# Altium footprint library NRF91.PcbLib: 113 footprints (part 6 of 8)
Each footprint in its own frame and in the unit in brackets; x right, y up, seen from the top. Pads: shape width x height; smd on the part's side, far side on the other; paste and mask are expansions set on the pad; w line width, h text height; cw(c..) or ccw(c..) is an arc to the next point about the centre after c.
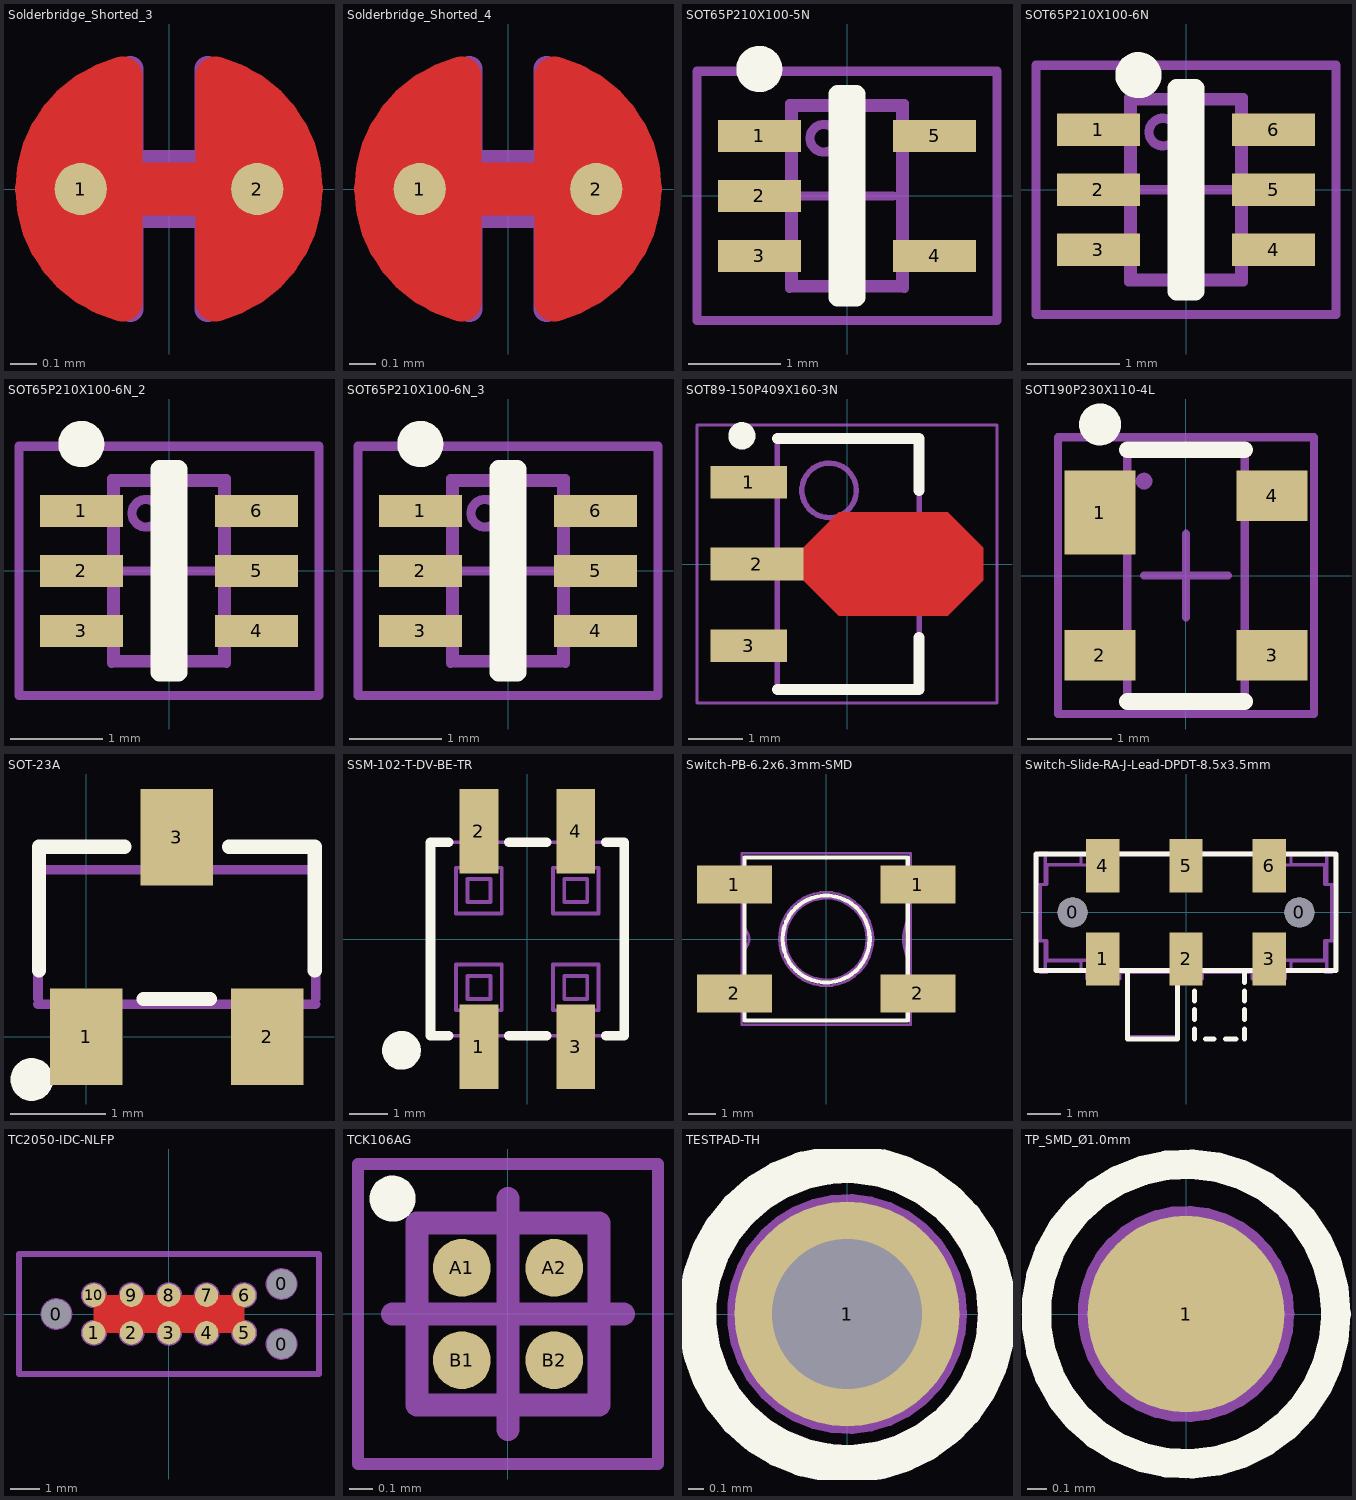
[diagram p5: the footprints below, top view; thin cyan lines are the x and y axes]

## Solderbridge_Shorted_3 [mm]
pads (2):
  round 0.2 smd paste-10: 1(-0.338,0) 2(0.338,0)
Top Layer:
  region: 0.102,0.432 0.178,0.505 0.296,0.467 0.361,0.424 0.434,0.351 0.488,0.292 0.546,0.193 0.574,0.099 0.569,-0.122 0.544,-0.193 0.46,-0.33 0.376,-0.411 0.284,-0.469 0.183,-0.5 0.132,-0.483 0.102,-0.43
  region: -0.102,-0.432 -0.178,-0.505 -0.296,-0.467 -0.361,-0.424 -0.434,-0.351 -0.488,-0.292 -0.546,-0.193 -0.574,-0.099 -0.569,0.122 -0.544,0.193 -0.46,0.33 -0.376,0.411 -0.284,0.469 -0.183,0.5 -0.132,0.483 -0.102,0.43
  lines w0.152: -0.178,-0.431 cw(c-0.068,0) -0.178,0.431 ; 0.178,-0.431 ccw(c0.068,0) 0.178,0.431
  lines w0.203: -0.338,0 0.338,0
Top Solder:
  circle w0.61: c-0.028,0 r0.279
  circle w0.61: c0.028,0 r0.279
Mechanical 7:
  lines w0.1: -0.148,-0.459 cw(c-0.067,0) -0.148,0.459 -0.148,0.1 0.148,0.1 0.148,0.459 cw(c0.067,0) 0.148,-0.459 0.148,-0.1 -0.148,-0.1 -0.148,-0.459
  text ".Designator" at -0.635,0.635 h0.38

## Solderbridge_Shorted_4 [mm]
pads (2):
  round 0.2 smd paste-10: 1(-0.338,0) 2(0.338,0)
Top Layer:
  region: 0.102,0.432 0.178,0.505 0.296,0.467 0.361,0.424 0.434,0.351 0.488,0.292 0.546,0.193 0.574,0.099 0.569,-0.122 0.544,-0.193 0.46,-0.33 0.376,-0.411 0.284,-0.469 0.183,-0.5 0.132,-0.483 0.102,-0.43
  region: -0.102,-0.432 -0.178,-0.505 -0.296,-0.467 -0.361,-0.424 -0.434,-0.351 -0.488,-0.292 -0.546,-0.193 -0.574,-0.099 -0.569,0.122 -0.544,0.193 -0.46,0.33 -0.376,0.411 -0.284,0.469 -0.183,0.5 -0.132,0.483 -0.102,0.43
  lines w0.152: -0.178,-0.431 cw(c-0.068,0) -0.178,0.431 ; 0.178,-0.431 ccw(c0.068,0) 0.178,0.431
  lines w0.203: -0.338,0 0.338,0
Top Solder:
  circle w0.61: c-0.028,0 r0.279
  circle w0.61: c0.028,0 r0.279
Mechanical 7:
  lines w0.1: -0.148,-0.459 cw(c-0.067,0) -0.148,0.459 -0.148,0.1 0.148,0.1 0.148,0.459 cw(c0.067,0) 0.148,-0.459 0.148,-0.1 -0.148,-0.1 -0.148,-0.459
  text ".Designator" at -0.635,0.635 h0.38

## SOT65P210X100-5N [mm]
pads (5):
  rect 0.9x0.35 smd: 1(-0.95,0.65) 2(-0.95,0) 3(-0.95,-0.65) 4(0.95,-0.65) 5(0.95,0.65)
Top Overlay:
  circle w0.25: c-0.95,1.375 r0.125
  lines w0.2: -0.1,-1.1 -0.1,1.1 0.1,1.1 0.1,-1.1 -0.1,-1.1
Mechanical 7:
  circle w0.1: c-0.25,0.625 r0.15
  lines w0.1: -1.048,-0.748 -1.048,-0.545 ; -1.048,-0.101 -1.048,0.103 ; -1.048,0.547 -1.048,0.75 ; -0.862,-0.76 -0.862,-0.532 ; -0.862,-0.113 -0.862,0.115 ; -0.862,0.534 -0.862,0.762 ; -0.624,-0.999 -0.624,-0.998 ; -0.624,-0.76 -0.624,-0.998 ; -0.624,-0.532 -0.624,-0.113 ; -0.624,0.115 -0.624,0.534 ; -0.624,0.762 -0.624,1 0.624,1 0.624,0.762 ; 0.624,-0.999 0.624,-0.998 ; 0.624,-0.76 0.624,-0.998 ; 0.624,-0.532 0.624,0.534 ; 0.862,-0.76 0.862,-0.532 ; 0.862,0.534 0.862,0.762 ; 1.048,-0.748 1.048,-0.545 ; 1.048,0.547 1.048,0.75 ; -0.624,-0.998 0.624,-0.998 ; -1.048,-0.76 -0.611,-0.76 -0.611,-0.532 -1.048,-0.532 -1.048,-0.76 ; -1.048,-0.113 -1.048,0.115 -0.611,0.115 -0.611,-0.113 -1.048,-0.113 ; -1.048,0.534 -0.611,0.534 -0.611,0.762 -1.048,0.762 -1.048,0.534 ; -0.582,-0.96 -0.582,0.961 0.582,0.961 0.582,-0.96 -0.582,-0.96 ; 0.611,-0.76 0.611,-0.532 1.048,-0.532 1.048,-0.76 0.611,-0.76 ; 0.611,0.534 0.611,0.762 1.048,0.762 1.048,0.534 0.611,0.534
  text ".Designator" at 0.4,-0.55 h0.38
Mechanical 15:
  lines w0.1: -0.5,0 0.5,0 ; 0,-0.5 0,0.5 ; -1.625,-1.35 1.625,-1.35 1.625,1.35 -1.625,1.35 -1.625,-1.35
3D body "User Library-SC70-5.STEP": height 0.97, standoff 0, extent -1.1,-1 1.1,1

## SOT65P210X100-6N [mm]
pads (6):
  rect 0.9x0.35 smd: 1(-0.95,0.65) 2(-0.95,0) 3(-0.95,-0.65) 4(0.95,-0.65) 5(0.95,0) 6(0.95,0.65)
Top Overlay:
  circle w0.25: c-0.515,1.242 r0.125
  lines w0.2: -0.1,-1.1 -0.1,1.1 0.1,1.1 0.1,-1.1 -0.1,-1.1
Mechanical 7:
  circle w0.1: c-0.25,0.625 r0.15
  lines w0.1: -1.048,-0.748 -1.048,-0.545 ; -1.048,-0.101 -1.048,0.103 ; -1.048,0.547 -1.048,0.75 ; -0.862,-0.76 -0.862,-0.532 ; -0.862,-0.113 -0.862,0.115 ; -0.862,0.534 -0.862,0.762 ; -0.624,-0.999 -0.624,-0.998 ; -0.624,-0.76 -0.624,-0.998 ; -0.624,-0.532 -0.624,-0.113 ; -0.624,0.115 -0.624,0.534 ; -0.624,0.762 -0.624,1 0.624,1 0.624,0.762 ; 0.624,-0.999 0.624,-0.998 ; 0.624,-0.76 0.624,-0.998 ; 0.624,-0.532 0.624,-0.113 ; 0.624,0.115 0.624,0.534 ; 0.862,-0.76 0.862,-0.532 ; 0.862,-0.113 0.862,0.115 ; 0.862,0.534 0.862,0.762 ; 1.048,-0.748 1.048,-0.545 ; 1.048,-0.101 1.048,0.103 ; 1.048,0.547 1.048,0.75 ; -0.624,-0.998 0.624,-0.998 ; -1.048,-0.76 -1.048,-0.532 -0.611,-0.532 -0.611,-0.76 -1.048,-0.76 ; -1.048,-0.113 -0.611,-0.113 -0.611,0.115 -1.048,0.115 -1.048,-0.113 ; -1.048,0.534 -1.048,0.762 -0.611,0.762 -0.611,0.534 -1.048,0.534 ; -0.582,-0.96 0.582,-0.96 0.582,0.961 -0.582,0.961 -0.582,-0.96 ; 0.611,-0.76 1.048,-0.76 1.048,-0.532 0.611,-0.532 0.611,-0.76 ; 0.611,-0.113 0.611,0.115 1.048,0.115 1.048,-0.113 0.611,-0.113 ; 0.611,0.534 1.048,0.534 1.048,0.762 0.611,0.762 0.611,0.534
  text ".Designator" at 0.4,-0.55 h0.38
Mechanical 15:
  lines w0.1: -0.5,0 0.5,0 ; 0,-0.5 0,0.5 ; -1.625,-1.35 1.625,-1.35 1.625,1.35 -1.625,1.35 -1.625,-1.35
3D body "SW3dPS-SC70-6.STEP": height 0.92, standoff -0.03, extent -1.05,-1 1.05,1

## SOT65P210X100-6N_2 [mm]
pads (6):
  rect 0.9x0.35 smd: 1(-0.95,0.65) 2(-0.95,0) 3(-0.95,-0.65) 4(0.95,-0.65) 5(0.95,0) 6(0.95,0.65)
Top Overlay:
  circle w0.25: c-0.95,1.375 r0.125
  lines w0.2: -0.1,-1.1 0.1,-1.1 0.1,1.1 -0.1,1.1 -0.1,-1.1
Mechanical 7:
  circle w0.1: c-0.25,0.625 r0.15
  lines w0.1: -1.048,-0.748 -1.048,-0.545 ; -1.048,-0.101 -1.048,0.103 ; -1.048,0.547 -1.048,0.75 ; -0.862,-0.76 -0.862,-0.532 ; -0.862,-0.113 -0.862,0.115 ; -0.862,0.534 -0.862,0.762 ; -0.624,-0.999 -0.624,-0.998 ; -0.624,-0.76 -0.624,-0.998 ; -0.624,-0.532 -0.624,-0.113 ; -0.624,0.115 -0.624,0.534 ; -0.624,0.762 -0.624,1 0.624,1 0.624,0.762 ; 0.624,-0.999 0.624,-0.998 ; 0.624,-0.76 0.624,-0.998 ; 0.624,-0.532 0.624,-0.113 ; 0.624,0.115 0.624,0.534 ; 0.862,-0.76 0.862,-0.532 ; 0.862,-0.113 0.862,0.115 ; 0.862,0.534 0.862,0.762 ; 1.048,-0.748 1.048,-0.545 ; 1.048,-0.101 1.048,0.103 ; 1.048,0.547 1.048,0.75 ; -0.624,-0.998 0.624,-0.998 ; -1.048,-0.76 -0.611,-0.76 -0.611,-0.532 -1.048,-0.532 -1.048,-0.76 ; -1.048,-0.113 -1.048,0.115 -0.611,0.115 -0.611,-0.113 -1.048,-0.113 ; -1.048,0.534 -0.611,0.534 -0.611,0.762 -1.048,0.762 -1.048,0.534 ; -0.582,-0.96 -0.582,0.961 0.582,0.961 0.582,-0.96 -0.582,-0.96 ; 0.611,-0.76 0.611,-0.532 1.048,-0.532 1.048,-0.76 0.611,-0.76 ; 0.611,-0.113 1.048,-0.113 1.048,0.115 0.611,0.115 0.611,-0.113 ; 0.611,0.534 0.611,0.762 1.048,0.762 1.048,0.534 0.611,0.534
  text ".Designator" at 0.4,-0.55 h0.38
Mechanical 15:
  lines w0.1: -0.5,0 0.5,0 ; 0,-0.5 0,0.5 ; -1.625,-1.35 -1.625,1.35 1.625,1.35 1.625,-1.35 -1.625,-1.35
3D body "SW3dPS-SC70-6.STEP": height 0.92, standoff -0.03, extent -1.05,-1 1.05,1

## SOT65P210X100-6N_3 [mm]
pads (6):
  rect 0.9x0.35 smd: 1(-0.95,0.65) 2(-0.95,0) 3(-0.95,-0.65) 4(0.95,-0.65) 5(0.95,0) 6(0.95,0.65)
Top Overlay:
  circle w0.25: c-0.95,1.375 r0.125
  lines w0.2: -0.1,-1.1 -0.1,1.1 0.1,1.1 0.1,-1.1 -0.1,-1.1
Mechanical 7:
  circle w0.1: c-0.25,0.625 r0.15
  lines w0.1: -1.048,-0.748 -1.048,-0.545 ; -1.048,-0.101 -1.048,0.103 ; -1.048,0.547 -1.048,0.75 ; -0.862,-0.76 -0.862,-0.532 ; -0.862,-0.113 -0.862,0.115 ; -0.862,0.534 -0.862,0.762 ; -0.624,-0.999 -0.624,-0.998 ; -0.624,-0.76 -0.624,-0.998 ; -0.624,-0.532 -0.624,-0.113 ; -0.624,0.115 -0.624,0.534 ; -0.624,0.762 -0.624,1 0.624,1 0.624,0.762 ; 0.624,-0.999 0.624,-0.998 ; 0.624,-0.76 0.624,-0.998 ; 0.624,-0.532 0.624,-0.113 ; 0.624,0.115 0.624,0.534 ; 0.862,-0.76 0.862,-0.532 ; 0.862,-0.113 0.862,0.115 ; 0.862,0.534 0.862,0.762 ; 1.048,-0.748 1.048,-0.545 ; 1.048,-0.101 1.048,0.103 ; 1.048,0.547 1.048,0.75 ; -0.624,-0.998 0.624,-0.998 ; -1.048,-0.76 -1.048,-0.532 -0.611,-0.532 -0.611,-0.76 -1.048,-0.76 ; -1.048,-0.113 -0.611,-0.113 -0.611,0.115 -1.048,0.115 -1.048,-0.113 ; -1.048,0.534 -1.048,0.762 -0.611,0.762 -0.611,0.534 -1.048,0.534 ; -0.582,-0.96 0.582,-0.96 0.582,0.961 -0.582,0.961 -0.582,-0.96 ; 0.611,-0.76 1.048,-0.76 1.048,-0.532 0.611,-0.532 0.611,-0.76 ; 0.611,-0.113 0.611,0.115 1.048,0.115 1.048,-0.113 0.611,-0.113 ; 0.611,0.534 1.048,0.534 1.048,0.762 0.611,0.762 0.611,0.534
  text ".Designator" at 0.4,-0.55 h0.38
Mechanical 15:
  lines w0.1: -0.5,0 0.5,0 ; 0,-0.5 0,0.5 ; -1.625,-1.35 1.625,-1.35 1.625,1.35 -1.625,1.35 -1.625,-1.35
3D body "SW3dPS-SC70-6.STEP": height 0.92, standoff -0.03, extent -1.05,-1 1.05,1

## SOT89-150P409X160-3N [mm]
pads (3):
  rect 1.4x0.6 smd: 1(-1.8,1.5) 3(-1.8,-1.5)
  rect 1.7x0.6 smd: 2(-1.65,0)
Top Layer:
  region: -0.8,0.3 -0.15,0.95 1.85,0.95 2.5,0.3 2.5,-0.3 1.85,-0.95 -0.15,-0.95 -0.8,-0.3
Top Overlay:
  circle w0.25: c-1.928,2.35 r0.125
  lines w0.2: -1.278,-2.3 1.322,-2.3 1.322,-1.35 ; -1.278,2.3 1.322,2.3 1.322,1.35
Mechanical 7:
  circle w0.1: c-0.327,1.35 r0.5
  lines w0.1: -1.278,-2.3 1.322,-2.3 1.322,2.3 -1.278,2.3 -1.278,-2.3
  text ".Designator" at -0.889,-0.127 h0.38
Mechanical 15:
  lines w0.05: -2.75,-2.55 2.75,-2.55 2.75,2.55 -2.75,2.55 -2.75,-2.55
  lines w0.1: -0.478,0 0.523,0 ; 0.022,-0.5 0.023,0.5
3D body "SOT89-150P409X160-3N.step": height 1.6, standoff 0, extent -2.2,-2.297 1.93,2.297

## SOT190P230X110-4L [mm]
pads (4):
  rect 0.85x1 smd: 1(-1.025,0.75)
  rect 0.85x0.6 smd: 2(-1.025,-0.95) 3(1.025,-0.95) 4(1.025,0.95)
Top Overlay:
  circle w0.25: c-1.025,1.8 r0.125
  lines w0.2: -0.7,-1.5 0.7,-1.5 ; -0.7,1.5 0.7,1.5
Mechanical 7:
  circle w0.1: c-0.5,1.125 r0.05
  lines w0.1: -0.7,-1.5 0.7,-1.5 0.7,1.5 -0.7,1.5 -0.7,-1.5
  text ".Designator" at -0.225,1.375 h0.69
Mechanical 15:
  lines w0.1: -0.5,0 0.5,0 ; 0,-0.5 0,0.5 ; -1.525,-1.65 1.525,-1.65 1.525,1.65 -1.525,1.65 -1.525,-1.65
3D body "User Library-sot143.step": height 1, standoff 0, extent -1.21,-1.46 1.21,1.46

## SOT-23A [mil]
pads (3):
  rect 30x40 smd: 1(0,0) 2(74.8,0) 3(37.4,82.68)
Top Overlay:
  circle w9.84: c-22.6,-17.62 r3.94
  lines w5.91: -19.68,27.56 -19.68,78.74 15.75,78.74 ; 23.62,15.75 51.18,15.75 ; 59.06,78.74 94.49,78.74 94.49,27.56
Mechanical 7:
  lines w3.94: -20.07,13.56 94.89,13.56 ; -20.07,15.75 -20.07,69.32 94.89,69.32 94.89,15.75
  lines w4.02: -8.27,13.56 -8.27,-7.51 8.27,-7.51 8.27,13.56 ; 29.13,69.32 29.13,90.18 45.67,90.18 45.67,69.32 ; 66.54,13.56 66.54,-7.51 83.07,-7.51 83.07,13.56
  text ".Designator" at 16.48,34.51 h15
3D body "User Library-sot23-1.step": height 39.37, standoff 0, extent -20.07,-4.72 94.89,87.41

## SSM-102-T-DV-BE-TR [mm]
pads (4):
  rect 1.02x2.22 smd: 1(-1.27,-2.825) 2(-1.27,2.825) 3(1.27,-2.825) 4(1.27,2.825)
Top Overlay:
  circle w0.508: c-3.302,-2.921 r0.254
  lines w0.254: -2.06,-2.54 -2.54,-2.54 -2.54,2.54 -2.06,2.54 ; -0.49,-2.54 0.5,-2.54 ; -0.49,2.54 0.5,2.54 ; 2.06,-2.54 2.54,-2.54 2.54,2.54 2.06,2.54
Mechanical 7:
  lines w0.1: -1.62,-2.54 -1.62,-3.082 ccw(c-1.27,-3.082) -0.92,-3.082 -0.92,-2.54 ; -1.62,2.54 -1.62,3.082 cw(c-1.27,3.082) -0.92,3.082 -0.92,2.54 ; 0.92,-2.54 0.92,-3.082 ccw(c1.27,-3.082) 1.62,-3.082 1.62,-2.54 ; 0.92,2.54 0.92,3.082 cw(c1.27,3.082) 1.62,3.082 1.62,2.54 ; -2.54,-2.54 2.54,-2.54 2.54,2.54 -2.54,2.54 -2.54,-2.54 ; -1.87,-1.87 -0.67,-1.87 -0.67,-0.67 -1.87,-0.67 -1.87,-1.87 ; -1.87,0.67 -1.87,1.87 -0.67,1.87 -0.67,0.67 -1.87,0.67 ; -1.57,-1.57 -0.97,-1.57 -0.97,-0.97 -1.57,-0.97 -1.57,-1.57 ; -1.57,0.97 -1.57,1.57 -0.97,1.57 -0.97,0.97 -1.57,0.97 ; 0.67,-1.87 1.87,-1.87 1.87,-0.67 0.67,-0.67 0.67,-1.87 ; 0.67,0.67 0.67,1.87 1.87,1.87 1.87,0.67 0.67,0.67 ; 0.97,-1.57 1.57,-1.57 1.57,-0.97 0.97,-0.97 0.97,-1.57 ; 0.97,0.97 0.97,1.57 1.57,1.57 1.57,0.97 0.97,0.97
  text ".Designator" at -1.829,-0.127 h0.38
3D body "SSM-102-T-DV-BE-TR.stp": height 7.47, standoff 0.05, extent -2.54,-3.518 2.54,3.518

## Switch-PB-6.2x6.3mm-SMD [mm]
pads (4):
  rect 2.75x1.4 smd: 1(-3.375,2) 1(3.375,2) 2(-3.375,-2) 2(3.375,-2)
Top Overlay:
  circle w0.152: c0,0 r1.601
  lines w0.152: -3,-3 3,-3 3,3 -3,3 -3,-3
Mechanical 7:
  circle w0.1: c0,0 r1.721
  circle w0.1: c0,0 r1.5
  lines w0.1: -3.3,-2.393 -3.3,-1.606 ; -3.3,1.606 -3.3,2.393 ; -3.1,-2.393 -3.6,-2.393 -3.6,-1.606 -3.1,-1.606 ; -3.1,-0.441 ccw(c-3.335,0) -3.1,0.441 ; -3.1,1.606 -3.6,1.606 -3.6,2.393 -3.1,2.393 ; 3.1,-2.393 3.6,-2.393 3.6,-1.606 3.1,-1.606 ; 3.1,-0.91 cw(c4.561,0) 3.1,0.91 ; 3.1,1.606 3.6,1.606 3.6,2.393 3.1,2.393 ; 3.3,-2.393 3.3,-1.606 ; 3.3,1.606 3.3,2.393 ; -3.1,-3.15 -3.1,3.15 3.1,3.15 3.1,-3.15 -3.1,-3.15
  text ".Designator" at -0.475,-0.15 h0.38
3D body "Switch tact 6x6mm.stp": height 3.1, standoff 0, extent -4,-3 4,3.3

## Switch-Slide-RA-J-Lead-DPDT-8.5x3.5mm [mm]
pads (8):
  round 0.9 hole 0.9 unplated: 0(-3.4,0) 0(3.4,0)
  rect 1x1.6 smd: 1(-2.5,-1.4) 2(0,-1.4) 3(2.5,-1.4) 4(-2.5,1.4) 5(0,1.4) 6(2.5,1.4)
Top Overlay:
  lines w0.152: -1.75,-1.75 -1.75,-3.8 -0.25,-3.8 -0.25,-1.75 ; 0.25,-3.8 0.25,-3.5 ; 0.25,-3.22 0.25,-2.92 ; 0.25,-2.66 0.25,-2.36 ; 0.25,-2.1 0.25,-1.75 ; 0.59,-3.8 0.84,-3.8 ; 1.19,-3.8 1.44,-3.8 ; 1.2,-3.8 1.5,-3.8 ; 1.75,-3.8 1.75,-3.5 ; 1.75,-3.22 1.75,-2.92 ; 1.75,-2.66 1.75,-2.36 ; 1.75,-2.1 1.75,-1.75 ; -4.5,-1.75 4.5,-1.75 4.5,1.75 -4.5,1.75 -4.5,-1.75
Mechanical 7:
  lines w0.1: -4.376,-1.747 -4.376,-1.797 -4.174,-1.797 -4.174,-1.747 ; -4.376,1.731 -4.376,1.781 -4.174,1.781 -4.174,1.731 ; -4.224,-1.747 -4.224,-0.853 ; -4.224,-1.449 -3.151,-1.449 -3.151,-1.747 ; -4.224,0.836 -4.224,1.731 ; -4.224,1.433 -3.151,1.433 -3.151,1.731 ; -2.982,-1.747 -2.982,-1.996 -1.988,-1.996 -1.988,-1.797 ; -2.783,-1.747 -2.783,-1.797 -2.772,-1.797 ; -2.783,1.731 -2.783,1.781 -2.772,1.781 ; -2.772,-1.747 -4.472,-1.747 -4.472,-0.853 -4.376,-0.853 ; -2.772,1.731 -4.472,1.731 -4.472,0.836 -4.376,0.836 ; -1.74,-1.797 -1.74,-3.735 -0.249,-3.735 -0.249,-1.797 ; -0.249,-1.996 0.496,-1.996 0.496,-1.797 ; 1.987,-1.797 1.987,-1.996 2.981,-1.996 2.981,-1.747 ; 2.77,-1.747 4.471,-1.747 4.471,-0.853 4.375,-0.853 ; 2.77,1.731 4.471,1.731 4.471,0.836 4.375,0.836 ; 2.782,-1.747 2.782,-1.797 2.77,-1.797 ; 2.782,1.731 2.782,1.781 2.77,1.781 ; 3.149,-1.747 3.149,-1.449 4.223,-1.449 ; 3.149,1.731 3.149,1.433 4.223,1.433 ; 4.173,-1.747 4.173,-1.797 4.375,-1.797 4.375,-1.747 ; 4.173,1.731 4.173,1.781 4.375,1.781 4.375,1.731 ; 4.223,-1.747 4.223,-0.853 ; 4.223,0.836 4.223,1.731 ; -4.376,-0.853 -4.168,-0.853 -4.168,-1.434 -2.772,-1.434 -2.772,-1.797 ; -4.376,-0.853 -4.376,0.836 ; -4.376,0.836 -4.168,0.836 -4.168,1.418 -2.772,1.418 -2.772,1.781 ; -2.772,-1.797 2.77,-1.797 ; -2.772,1.781 2.77,1.781 ; 2.77,-1.797 2.77,-1.434 4.166,-1.434 4.166,-0.853 4.375,-0.853 ; 2.77,1.781 2.77,1.418 4.166,1.418 4.166,0.836 4.375,0.836 ; 4.375,-0.853 4.375,0.836
  text ".Designator" at -0.9,-0.2 h0.38
3D body "CL-SB-22A-11T.stp": height 3.5, standoff 0, extent -4.25,-3.75 4.25,1.75

## TC2050-IDC-NLFP [mil]
pads (13):
  round 39 hole 39 unplated: 0(-150,0) 0(150,-40) 0(150,40)
  round 31 smd paste-196.85: 1(-100,-25) 2(-50,-25) 3(0,-25) 4(50,-25) 5(100,-25) 6(100,25) 7(50,25) 8(0,25) 9(-50,25) 10(-100,25)
Top Layer:
  pour cut-out: -100,25 -100,-25 100,-25 100,25
Mechanical 7:
  circle w3.94: c-100,24.99 r15.45
  circle w3.94: c-100,-24.99 r15.45
  circle w3.94: c-50,-24.99 r15.45
  circle w3.94: c0,-24.99 r15.45
  circle w3.94: c0,24.99 r15.45
  circle w3.94: c-50,24.99 r15.45
  circle w3.94: c50,24.99 r15.45
  circle w3.94: c50,-24.99 r15.45
  circle w3.94: c100,-24.99 r15.45
  circle w3.94: c100,24.99 r15.45
  circle w3.94: c150,-39.98 r19.26
  circle w3.94: c150,39.98 r19.26
  circle w3.94: c-150,0 r19.26
  text ".Designator" at -35.43,-64.96 h15
Mechanical 8:
  circle w3.94: c-150,0 r19.26
  circle w3.94: c150,39.98 r19.26
  circle w3.94: c150,-39.98 r19.26
Mechanical 15:
  lines w7.87: -199.8,-79.92 -199.8,79.92 199.8,79.92 199.8,-79.92 -199.8,-79.92

## TCK106AG [mm]
pads (4):
  round 0.25 smd: A1(-0.2,0.2) A2(0.2,0.2) B1(-0.2,-0.2) B2(0.2,-0.2)
Top Overlay:
  circle w0.1: c-0.5,0.5 r0.05
Mechanical 13:
  lines w0.1: -0.395,-0.395 -0.395,0.395 0.395,0.395 0.395,-0.395 -0.395,-0.395
Mechanical 15:
  lines w0.05: -0.65,-0.65 -0.65,0.65 0.65,0.65 0.65,-0.65 -0.65,-0.65
  lines w0.1: -0.5,0 0.5,0 ; 0,-0.5 0,0.5
3D body "TCK106AG,LF.step": height 0.55, standoff 0, extent -0.395,-0.395 0.395,0.395

## TESTPAD-TH [mm]
pads (1):
  round 1.5 hole 1: 1(0,0)
Top Overlay:
  circle w0.254: c0,0 r1
Mechanical 7:
  circle w0.1: c0,0 r0.5
  circle w0.1: c0,0 r0.75
  circle w0.1: c0,0 r1
  text ".Designator" at -0.5,1.15 h0.38

## TP_SMD_Ø1.0mm [mm]
pads (1):
  round 1 smd paste-5: 1(0,0)
Top Overlay:
  circle w0.15: c0,0 r0.762
Mechanical 7:
  circle w0.1: c0,0 r0.762
  circle w0.1: c0,0 r0.5
  text ".Designator" at -0.633,0.918 h0.38